# Altium footprint library Horizontal Plastic Modular Jack.PcbLib: 26 footprints (part 1 of 2)
Each footprint in its own frame and in the unit in brackets; x right, y up, seen from the top. Pads: shape width x height; smd on the part's side, far side on the other; paste and mask are expansions set on the pad; w line width, h text height; cw(c..) or ccw(c..) is an arc to the next point about the centre after c.
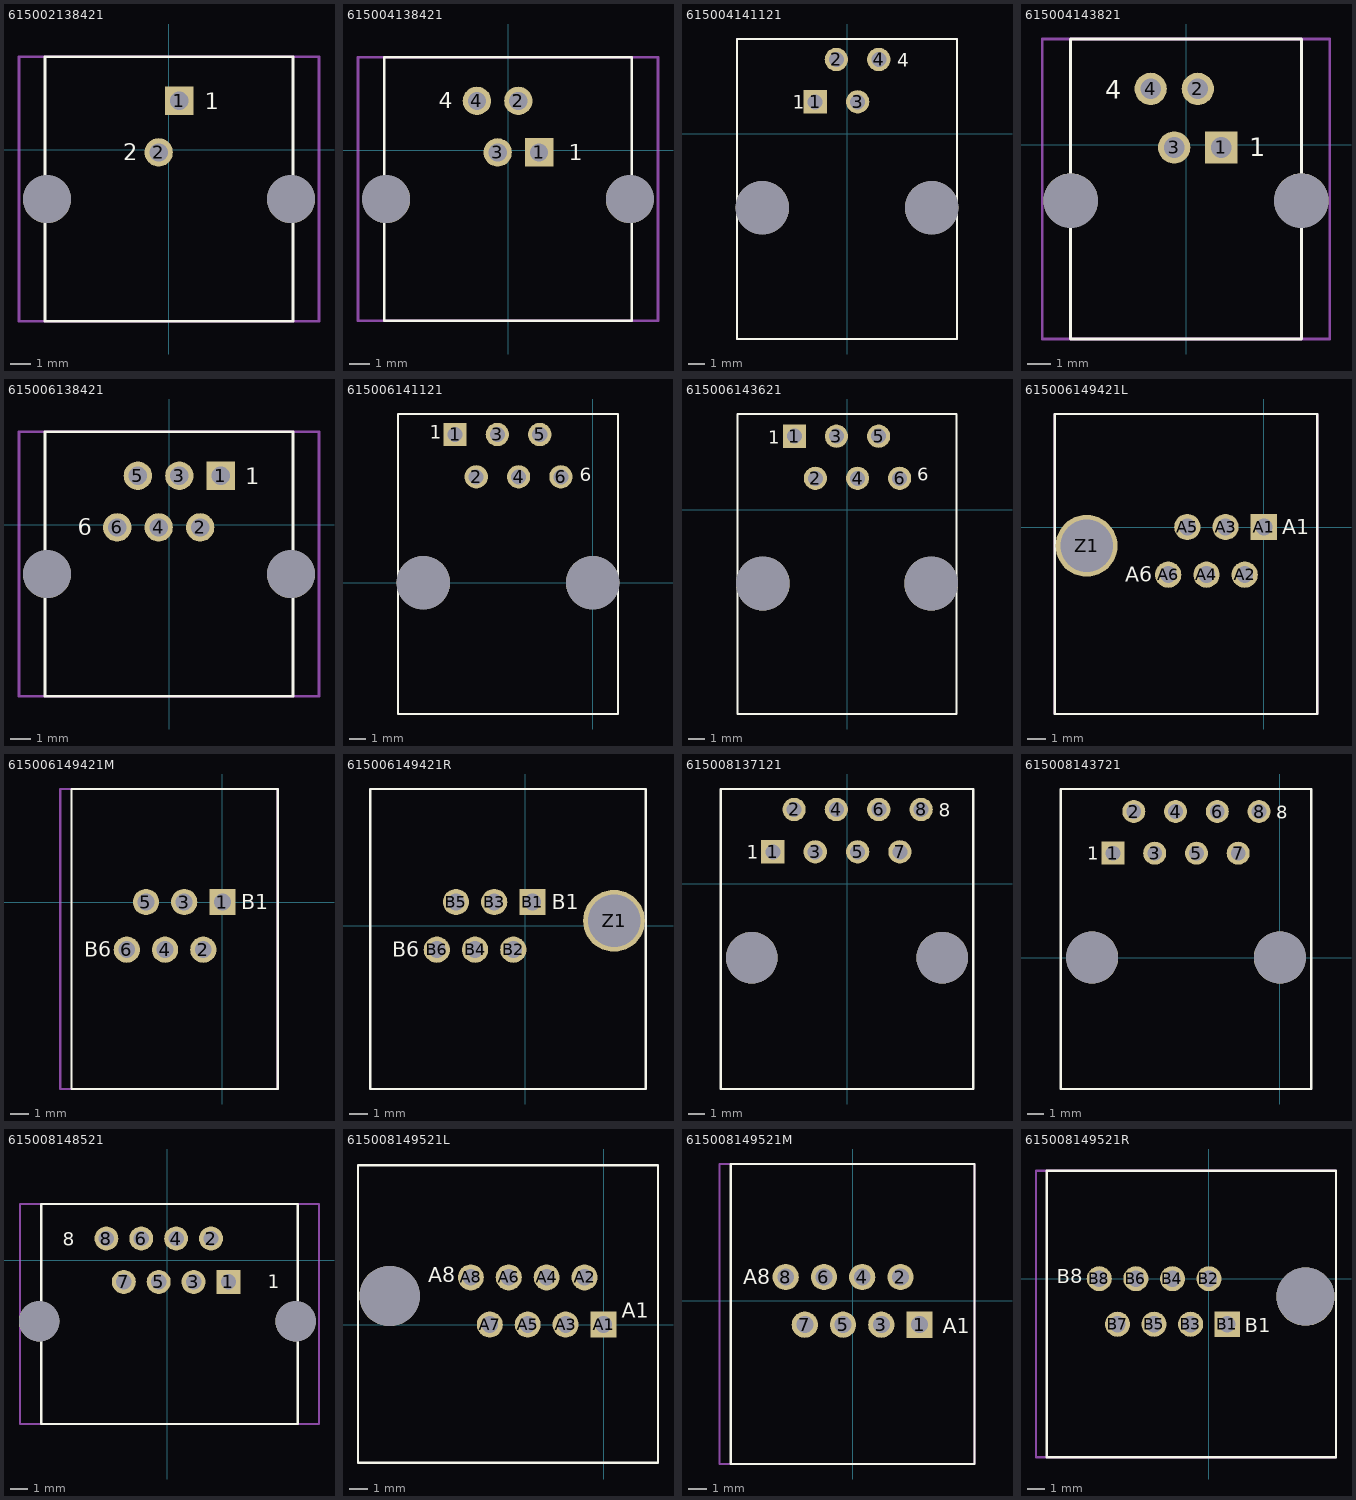
[diagram p0: the footprints below, top view; thin cyan lines are the x and y axes]

## 615002138421 [mm] "Horizontal Plastic 1x1 TH    6P2C Tab Up"
height 14.5
pads (4):
  rect 1.4x1.4 hole 0.9: 1(0.51,2.42)
  round 1.4 hole 0.9: 2(-0.51,-0.12)
  round 2.36 hole 2.36 unplated: ""(-6,-2.42) ""(6,-2.42)
Top Overlay:
  lines w0.127: -6.1,-8.42 -6.1,4.58 6.1,4.58 6.1,-8.42 -6.1,-8.42
  text "2" at -2.25,-0.5 h0.8
  text "1" at 1.75,2 h0.8
Mechanical 15:
  lines w0.127: -7.378,-8.42 -7.378,4.58 7.378,4.58 7.378,-8.42 -7.378,-8.42
3D body: height 14.51, standoff -3.29, extent -7.378,-8.42 7.378,4.58

## 615004138421 [mm] "Horizontal Plastic 1x1 TH    6P4C Tab Up"
height 14.5
pads (6):
  rect 1.4x1.4 hole 0.9: 1(1.53,-0.12)
  round 1.4 hole 0.9: 2(0.51,2.42) 3(-0.51,-0.12) 4(-1.53,2.42)
  round 2.36 hole 2.36 unplated: ""(-6,-2.42) ""(6,-2.42)
Top Overlay:
  lines w0.127: -6.1,-8.42 -6.1,4.58 6.1,4.58 6.1,-8.42 -6.1,-8.42
  text "1" at 3,-0.5 h0.8
  text "4" at -3.4,2.05 h0.8
Mechanical 15:
  lines w0.127: -7.389,-8.42 7.389,-8.42 7.389,4.58 -7.389,4.58 -7.389,-8.42
3D body: height 2.87, standoff -14.93, extent -7.389,-8.42 7.389,4.58

## 615004141121 [mm] "Horizontal Plastic 1x1 TH    6P4C Tab Down"
height 11.65
pads (6):
  rect 1.4x1.4 hole 0.9: 1(-1.905,1.905)
  round 1.4 hole 0.9: 2(-0.635,4.445) 3(0.635,1.905) 4(1.905,4.445)
  round 3.2 hole 3.2 unplated: ""(-5.08,-4.445) ""(5.08,-4.445)
Top Overlay:
  lines w0.127: -6.6,-12.325 -6.6,5.675 6.6,5.675 6.6,-12.325 -6.6,-12.325
  text "4" at 3,4 h0.8
  text "1" at -3.25,1.5 h0.8
Mechanical 15:
  lines w0.127: -6.6,-12.325 -6.6,5.675 6.6,5.675 6.6,-12.325 -6.6,-12.325
3D body: height 3.07, standoff -12.08, extent -6.6,-12.325 6.6,5.675

## 615004143821 [mm] "Horizontal Plastic 1x1 TH    4P4C Tab Up"
height 14.5
pads (6):
  rect 1.4x1.4 hole 0.9: 1(1.53,-0.12)
  round 1.4 hole 0.9: 2(0.51,2.42) 3(-0.51,-0.12) 4(-1.53,2.42)
  round 2.36 hole 2.36 unplated: ""(-5,-2.42) ""(5,-2.42)
Top Overlay:
  lines w0.127: -5,-8.42 5,-8.42 5,4.58 -5,4.58 -5,-8.42
  text "1" at 2.75,-0.5 h0.8
  text "4" at -3.5,2 h0.8
Mechanical 15:
  lines w0.127: -6.231,-8.42 -6.231,4.58 6.231,4.58 6.231,-8.42 -6.231,-8.42
3D body: height 3.02, standoff -14.93, extent -6.231,-8.42 6.231,4.58

## 615006138421 [mm] "Horizontal Plastic 1x1 TH  6P6C Tab Up"
height 14.5
pads (8):
  rect 1.4x1.4 hole 0.9: 1(2.55,2.42)
  round 1.4 hole 0.9: 2(1.53,-0.12) 3(0.51,2.42) 4(-0.51,-0.12) 5(-1.53,2.42) 6(-2.55,-0.12)
  round 2.36 hole 2.36 unplated: ""(-6,-2.42) ""(6,-2.42)
Top Overlay:
  lines w0.127: -6.1,-8.42 6.1,-8.42 6.1,4.58 -6.1,4.58 -6.1,-8.42
  text "1" at 3.75,2 h0.8
  text "6" at -4.5,-0.5 h0.8
Mechanical 15:
  lines w0.127: -7.378,-8.42 7.378,-8.42 7.378,4.58 -7.378,4.58 -7.378,-8.42
3D body: height 14.51, standoff -3.29, extent -7.378,-8.42 7.378,4.58

## 615006141121 [mm] "Horizontal Plastic 1x1 TH    6P6C Tab Down"
height 11.65
pads (8):
  rect 1.4x1.4 hole 0.9: 1(-8.255,8.89)
  round 1.4 hole 0.9: 2(-6.985,6.35) 3(-5.715,8.89) 4(-4.445,6.35) 5(-3.175,8.89) 6(-1.905,6.35)
  round 3.2 hole 3.2 unplated: ""(-10.16,0) ""(0,0)
Top Overlay:
  lines w0.127: -11.68,-7.88 1.52,-7.88 ; -11.68,-7.88 -11.68,10.12 ; -11.68,-7.88 1.52,-7.88 ; -11.68,-7.88 -11.68,10.12 ; -11.68,10.12 1.52,10.12 ; -11.68,10.12 1.52,10.12 ; 1.52,-7.88 1.52,10.12 ; 1.52,-7.88 1.52,10.12
  text "1" at -9.779,8.632 h0.8
  text "6" at -0.762,6.092 h0.8
3D body: height 11.66, standoff -3.49, extent -11.68,-7.88 1.52,10.12

## 615006143621 [mm] "Horizontal Plastic 1x1 TH    6P6C Tab Down"
height 12.57
pads (8):
  rect 1.4x1.4 hole 0.9: 1(-3.175,4.445)
  round 1.4 hole 0.9: 2(-1.905,1.905) 3(-0.635,4.445) 4(0.635,1.905) 5(1.905,4.445) 6(3.175,1.905)
  round 3.25 hole 3.25 unplated: ""(-5.08,-4.445) ""(5.08,-4.445)
Top Overlay:
  lines w0.127: -6.605,-12.315 6.605,-12.315 ; -6.605,-12.315 -6.605,5.785 ; -6.605,-12.315 6.605,-12.315 ; -6.605,-12.315 -6.605,5.785 ; -6.605,5.785 6.605,5.785 ; -6.605,5.785 6.605,5.785 ; 6.605,-12.315 6.605,5.785 ; 6.605,-12.315 6.605,5.785
  text "1" at -4.75,4 h0.8
  text "6" at 4.25,1.75 h0.8
3D body: height 12.58, standoff -3.42, extent -6.605,-12.315 6.605,5.785

## 615006149421L [mm] "WR-MJ_Modular Jack_Tab UP_6P6C Assembly Left Housing"
height 15.4
pads (7):
  rect 1.4x1.4 hole 0.9: A1(0,0)
  round 1.4 hole 0.9: A2(-1.02,-2.54) A3(-2.04,0) A4(-3.06,-2.54) A5(-4.08,0) A6(-5.1,-2.54)
  round 3.3 hole 2.8: Z1(-9.45,-1)
Top Overlay:
  lines w0.127: -11.15,-9.97 2.85,-9.97 2.85,6.03 -11.15,6.03 -11.15,-9.97
  text "A1" at 0.99,-0.381 h0.8
  text "A6" at -7.392,-2.921 h0.8
Mechanical 13:
  lines w0.127: -11.15,-9.97 2.85,-9.97 2.85,6.03 -11.15,6.03 -11.15,-9.97
3D body: height 15.41, standoff -3.38, extent -11.15,-9.97 2.85,6.03

## 615006149421M [mm] "WR-MJ_Modular Jack_Tab UP_6P6C Assembly Middlet Housing"
height 15.4
pads (6):
  rect 1.4x1.4 hole 0.9: 1(0,0)
  round 1.4 hole 0.9: 2(-1.02,-2.54) 3(-2.04,0) 4(-3.06,-2.54) 5(-4.08,0) 6(-5.1,-2.54)
Top Overlay:
  lines w0.127: -8.05,-9.97 2.95,-9.97 2.95,6.03 -8.05,6.03 -8.05,-9.97
  text "B1" at 1.006,-0.381 h0.8
  text "B6" at -7.376,-2.921 h0.8
Mechanical 13:
  lines w0.127: -8.65,-9.97 2.95,-9.97 2.95,6.03 -8.65,6.03 -8.65,-9.97
3D body: height 15.41, standoff -3.38, extent -8.65,-9.97 2.95,6.03

## 615006149421R [mm] "WR-MJ_Modular Jack_Tab UP_6P6C Assembly Right Housing"
height 15.4
pads (7):
  rect 1.4x1.4 hole 0.9: B1(0.375,1.27)
  round 1.4 hole 0.9: B2(-0.645,-1.27) B3(-1.665,1.27) B4(-2.685,-1.27) B5(-3.705,1.27) B6(-4.725,-1.27)
  round 3.3 hole 2.8: Z1(4.725,0.27)
Top Overlay:
  lines w0.127: -8.285,-8.7 6.425,-8.7 ; -8.285,-8.7 -8.285,7.3 ; -8.285,-8.7 6.425,-8.7 ; -8.285,-8.7 -8.285,7.3 ; -8.285,7.3 6.425,7.3 ; -8.285,7.3 6.425,7.3 ; 6.425,-8.7 6.425,7.3 ; 6.425,-8.7 6.425,7.3
  text "B1" at 1.397,0.889 h0.8
  text "B6" at -7.112,-1.651 h0.8
3D body: height 15.41, standoff -3.38, extent -8.285,-8.7 6.425,7.3

## 615008137121 [mm] "RJ45 Horizontal Tab down"
height 11.65
pads (10):
  rect 1.4x1.4 hole 0.9: 1(-4.445,1.905)
  round 1.4 hole 0.9: 2(-3.175,4.445) 3(-1.905,1.905) 4(-0.635,4.445) 5(0.635,1.905) 6(1.905,4.445) 7(3.175,1.905) 8(4.445,4.445)
  round 3.1 hole 3.1 unplated: ""(-5.715,-4.445) ""(5.715,-4.445)
Top Overlay:
  lines w0.127: -7.575,-12.325 -7.575,5.675 7.575,5.675 7.575,-12.325 -7.575,-12.325
  text "8" at 5.5,4 h0.8
  text "1" at -6,1.5 h0.8
3D body: height 11.69, standoff -4.04, extent -7.575,-12.325 7.575,5.675

## 615008143721 [mm] "Horizontal Plastic 1x1 TH    8P8C Tab Down"
height 12.6
pads (10):
  rect 1.4x1.4 hole 0.9: 1(-10.16,6.35)
  round 1.4 hole 0.9: 2(-8.89,8.89) 3(-7.62,6.35) 4(-6.35,8.89) 5(-5.08,6.35) 6(-3.81,8.89) 7(-2.54,6.35) 8(-1.27,8.89)
  round 3.17 hole 3.17 unplated: ""(-11.43,0) ""(0,0)
Top Overlay:
  lines w0.127: -13.34,-8 1.91,-8 ; -13.34,-8 1.91,-8 ; -13.34,-8 -13.34,10.26 ; -13.34,-8 -13.34,10.26 ; -13.34,10.26 1.91,10.26 ; -13.34,10.26 1.91,10.26 ; 1.91,-8 1.91,10.26 ; 1.91,-8 1.91,10.26
  text "1" at -11.715,5.945 h0.8
  text "8" at -0.215,8.445 h0.8
3D body: height 12.61, standoff -3.89, extent -13.335,-8 1.905,10.26

## 615008148521 [mm] "WR-MJ_Modular Jacks_Plastic  WR-MJ_Modular Jacks_Plastic_Horizontal_Tab UP"
height 14.5
pads (10):
  rect 1.4x1.4 hole 0.9: 1(3.57,-1.27)
  round 1.4 hole 0.9: 2(2.55,1.27) 3(1.53,-1.27) 4(0.51,1.27) 5(-0.51,-1.27) 6(-1.53,1.27) 7(-2.55,-1.27) 8(-3.57,1.27)
  round 2.36 hole 2.36 unplated: ""(-7.5,-3.57) ""(7.5,-3.57)
Top Overlay:
  lines w0.127: -7.375,-9.57 -7.375,3.28 7.625,3.28 7.625,-9.57 -7.375,-9.57
  text "1" at 5.875,-1.65 h0.8
  text "8" at -6.125,0.85 h0.8
Mechanical 15:
  lines w0.127: -8.615,-9.57 -8.615,3.28 8.865,3.28 8.865,-9.57 -8.615,-9.57
3D body: height 14.51, standoff -3.29, extent -8.615,-9.57 8.865,3.28

## 615008149521L [mm] "WR-MJ_Modular Jack_Tab UP_8P8C Assembly Left Housing"
height 15.4
pads (9):
  rect 1.4x1.4 hole 0.9: A1(0,0)
  round 1.4 hole 0.9: A2(-1.02,2.54) A3(-2.04,0) A4(-3.06,2.54) A5(-4.08,0) A6(-5.1,2.54) A7(-6.12,0) A8(-7.14,2.54)
  round 3.25 hole 3.25 unplated: ""(-11.51,1.54)
Top Overlay:
  lines w0.127: -13.21,-7.43 -13.21,8.57 ; -13.21,-7.43 2.93,-7.43 ; -13.21,-7.43 -13.21,8.57 ; -13.21,-7.43 2.93,-7.43 ; -13.21,8.57 2.93,8.57 ; -13.21,8.57 2.93,8.57 ; 2.93,-7.43 2.93,8.57 ; 2.93,-7.43 2.93,8.57
  text "A8" at -9.438,2.285 h0.8
  text "A1" at 0.976,0.38 h0.8
3D body: height 15.41, standoff -4.13, extent -13.21,-7.43 2.93,8.57

## 615008149521M [mm] "WR-MJ_Modular Jack_Tab UP_8P8C Assembly Left Housing"
height 15.4
pads (8):
  rect 1.4x1.4 hole 0.9: 1(3.57,-1.27)
  round 1.4 hole 0.9: 2(2.55,1.27) 3(1.53,-1.27) 4(0.51,1.27) 5(-0.51,-1.27) 6(-1.53,1.27) 7(-2.55,-1.27) 8(-3.57,1.27)
Top Overlay:
  lines w0.127: -6.5,-8.7 6.5,-8.7 6.5,7.3 -6.5,7.3 -6.5,-8.7
  text "A1" at 4.8,-1.73 h0.8
  text "A8" at -5.842,0.888 h0.8
Mechanical 13:
  lines w0.127: -7.1,-8.7 6.5,-8.7 6.5,7.3 -7.1,7.3 -7.1,-8.7
3D body: height 15.41, standoff -3.28, extent -7.1,-8.7 6.5,7.3

## 615008149521R [mm] "WR-MJ_Modular Jack_Tab UP_8P8C Assembly Right Housing"
height 15.4
pads (9):
  rect 1.4x1.4 hole 0.9: B1(1.02,-2.54)
  round 1.4 hole 0.9: B2(0,0) B3(-1.02,-2.54) B4(-2.04,0) B5(-3.06,-2.54) B6(-4.08,0) B7(-5.1,-2.54) B8(-6.12,0)
  round 3.25 hole 3.25 unplated: ""(5.39,-1)
Top Overlay:
  lines w0.127: -9.05,-9.97 -9.05,6.03 7.09,6.03 7.09,-9.97 -9.05,-9.97
  text "B8" at -8.493,-0.255 h0.8
  text "B1" at 2,-3 h0.8
Mechanical 13:
  lines w0.127: -9.65,-9.97 -9.65,6.03 7.09,6.03 7.09,-9.97 -9.65,-9.97
3D body: height 15.41, standoff -4.13, extent -9.65,-9.97 7.09,6.03